# Altium footprint library DrPCB.PcbLib: 910 footprints (part 20 of 57)
Each footprint in its own frame and in the unit in brackets; x right, y up, seen from the top. Pads: shape width x height; smd on the part's side, far side on the other; paste and mask are expansions set on the pad; w line width, h text height; cw(c..) or ccw(c..) is an arc to the next point about the centre after c.
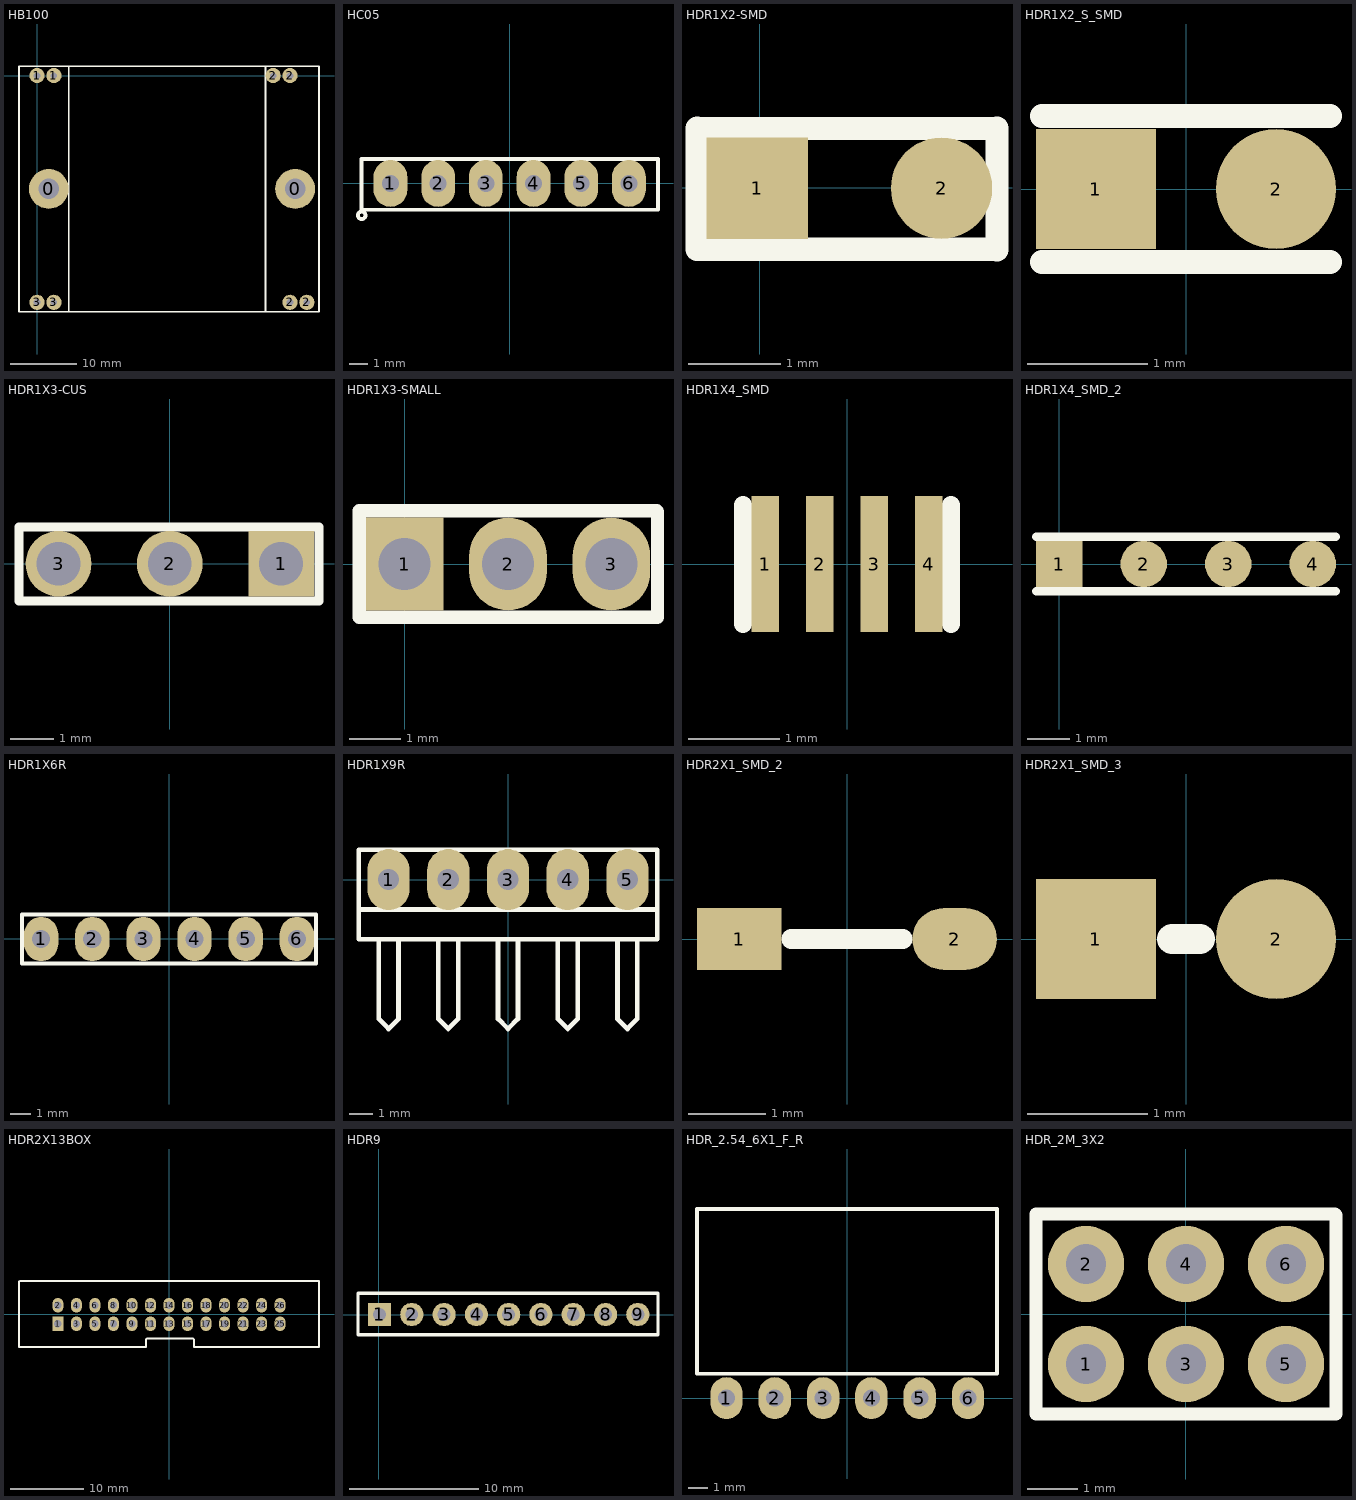
[diagram p19: the footprints below, top view; thin cyan lines are the x and y axes]

## HB100 [mm]
pads (10):
  round 6 hole 3.1: 0(1.778,-17.1) 0(38.935,-17.1)
  round 2.3 hole 1: 1(0,0) 1(2.54,0) 2(35.62,0) 2(38.16,-34.2) 2(38.16,0) 2(40.7,-34.2) 3(0,-34.2) 3(2.54,-34.2)
Top Overlay:
  lines w0.254: -2.722,1.397 -2.722,-35.61 42.535,-35.61 42.535,1.397 ; -2.718,1.4 42.532,1.4 ; 4.778,-35.607 4.778,1.4 ; 34.463,-35.607 34.463,1.4

## HC05 [mm] "HEADER FEMALE pitch: 2.54mm"
pads (6):
  oval 1.8x2.5 hole 0.9 mask+0.1: 1(-6.35,0) 2(-3.81,0) 3(-1.27,0) 4(1.27,0) 5(3.81,0) 6(6.35,0)
Top Overlay:
  circle w0.2: c-7.88,-1.7 r0.2
  lines w0.2: -7.9,-1.4 -7.9,1.3 7.9,1.3 7.9,-1.4 -7.9,-1.4
3D body "female_header_a-bl254-eg-g03d.stp": height 8.5, standoff -3.2, extent -7.745,-1.3 0.125,1.2
3D body "female_header_a-bl254-eg-g03d.stp": height 8.5, standoff -3.2, extent -0.125,-1.3 7.745,1.2
3D body "Bluetooth Module HC-05.STEP": height 45.26, standoff 2.43, extent -8,-0.374 8,6.426

## HDR1X2-SMD [mm]
pads (2):
  rect 1.1x1.1 smd: 1(-0.029,-0.005)
  round 1.1 smd: 2(1.971,-0.005)
Top Overlay:
  lines w0.254: -0.682,-0.668 2.572,-0.668 ; -0.678,-0.668 -0.678,0.643 ; -0.663,0.642 2.572,0.642 ; 2.572,-0.673 2.572,0.643

## HDR1X2_S_SMD [mm]
pads (2):
  rect 1x1 smd: 1(-0.75,0)
  round 1 smd: 2(0.75,0)
Top Overlay:
  lines w0.2: -1.2,-0.61 1.2,-0.61 ; -1.2,0.61 1.2,0.61

## HDR1X3-CUS [mm]
pads (3):
  rect 1.5x1.5 hole 1: 1(2.54,0)
  round 1.5 hole 1: 2(0,0) 3(-2.54,0)
Top Overlay:
  lines w0.2: -3.442,-0.851 -3.442,0.838 3.404,0.838 3.404,-0.851 -3.442,-0.851

## HDR1X3-SMALL [mm]
pads (3):
  rect 1.5x1.8 hole 1: 1(0,0)
  oval 1.5x1.8 hole 1: 2(2,0) 3(4,0)
Top Overlay:
  lines w0.254: 4.877,1.029 -0.876,1.029 -0.876,-1.029 4.889,-1.029 ; 4.889,-1.003 4.889,1.016

## HDR1X4_SMD [mm]
pads (4):
  rect 0.3x1.5 smd: 1(-0.9,0) 2(-0.3,0) 3(0.3,0) 4(0.9,0)
Top Overlay:
  lines w0.2: -1.143,-0.66 -1.143,0.648 ; 1.143,-0.66 1.143,0.648

## HDR1X4_SMD_2 [mm]
pads (4):
  rect 1.1x1.1 smd: 1(0,0)
  round 1.1 smd: 2(2,0) 3(4,0) 4(6,0)
Top Overlay:
  lines w0.2: -0.546,-0.648 6.54,-0.648 ; -0.546,0.648 6.54,0.648

## HDR1X6R [mm]
pads (6):
  oval 1.7x2.2 hole 0.9: 1(-6.35,0) 2(-3.81,0) 3(-1.27,0) 4(1.27,0) 5(3.81,0) 6(6.35,0)
Top Overlay:
  lines w0.2: -7.302,1.206 -7.302,-1.207 7.29,-1.206 ; -7.29,1.206 7.302,1.206 7.302,-1.206
3D body "User Library-Header_Male_RA_Low_6Pin.STEP": height 2.51, standoff -3, extent -7.607,-0.305 7.633,9.825

## HDR1X9R [mm] "Connector; Header; 5 Position"
pads (5):
  oval 1.8x2.6 hole 0.9 mask+0.1: 1(-5.08,0) 2(-2.54,0) 3(0,0) 4(2.54,0) 5(5.08,0)
Top Overlay:
  lines w0.2: -5.503,-2.54 -5.503,-5.927 -5.08,-6.35 -4.657,-5.927 -4.657,-2.54 ; -2.963,-2.54 -2.963,-5.927 -2.54,-6.35 -2.117,-5.927 -2.117,-2.54 ; -0.423,-2.54 -0.423,-5.927 0,-6.35 0.423,-5.927 0.423,-2.54 ; 2.117,-2.54 2.117,-5.927 2.54,-6.35 2.963,-5.927 2.963,-2.54 ; 4.657,-2.54 4.657,-5.927 5.08,-6.35 5.503,-5.927 5.503,-2.54 ; 6.35,-1.27 -6.35,-1.27 ; -6.35,-2.54 -6.35,1.27 ; -6.35,-2.54 6.35,-2.54 6.35,1.27 -6.35,1.27 ; -6.35,-2.54 -6.35,-1.27 ; -6.35,-1.27 -6.35,1.27
3D body "PLS-1R.step": height 5.45, standoff -3, extent 3.81,-7.35 6.35,1.27
3D body "PLS-1R.step": height 5.45, standoff -3, extent 1.27,-7.35 3.81,1.27
3D body "PLS-1R.step": height 5.45, standoff -3, extent -1.27,-7.35 1.27,1.27
3D body "PLS-1R.step": height 5.45, standoff -3, extent -3.81,-7.35 -1.27,1.27
3D body "PLS-1R.step": height 5.45, standoff -3, extent -6.35,-7.35 -3.81,1.27

## HDR2X1_SMD_2 [mm]
pads (2):
  rect 1.1x0.8 smd: 1(-1.4,0)
  oval 1.1x0.8 smd: 2(1.4,0)
Top Overlay:
  lines w0.254: -0.724,0 0.724,0

## HDR2X1_SMD_3 [mm]
pads (2):
  rect 1x1 smd: 1(-0.75,0)
  round 1 smd: 2(0.75,0)
Top Overlay:
  lines w0.254: -0.114,0 0.114,0

## HDR2X13BOX [mm]
pads (26):
  rect 1.5x2 hole 1: 1(-15.24,-1.27)
  oval 1.5x2 hole 1: 2(-15.24,1.27) 3(-12.7,-1.27) 4(-12.7,1.27) 5(-10.16,-1.27) 6(-10.16,1.27) 7(-7.62,-1.27) 8(-7.62,1.27) 9(-5.08,-1.27) 10(-5.08,1.27) 11(-2.54,-1.27) 12(-2.54,1.27) 13(0,-1.27) 14(0,1.27) 15(2.54,-1.27) 16(2.54,1.27) 17(5.08,-1.27) 18(5.08,1.27) 19(7.62,-1.27) 20(7.62,1.27) 21(10.16,-1.27) 22(10.16,1.27) 23(12.7,-1.27) 24(12.7,1.27) 25(15.24,-1.27) 26(15.24,1.27)
Top Overlay:
  lines w0.254: -20.574,4.555 -20.574,-4.445 -3.175,-4.445 -3.175,-3.429 -3.048,-3.302 3.302,-3.302 3.429,-3.429 3.429,-4.445 20.426,-4.445 ; -20.447,4.572 20.553,4.572 ; 20.574,-4.445 20.574,4.555

## HDR9 [mm]
pads (9):
  rect 1.8x1.8 hole 1: 1(0.068,0.035)
  round 1.8 hole 1: 2(2.568,0.035) 3(5.068,0.035) 4(7.568,0.035) 5(10.068,0.035) 6(12.568,0.035) 7(15.068,0.035) 8(17.568,0.035) 9(20.068,0.035)
Top Overlay:
  lines w0.254: -1.596,-1.533 21.627,-1.533 21.627,1.68 -1.596,1.68 -1.596,-1.533

## HDR_2.54_6X1_F_R [mm]
pads (6):
  oval 1.7x2.2 hole 0.9: 1(-6.35,0) 2(-3.81,0) 3(-1.27,0) 4(1.27,0) 5(3.81,0) 6(6.35,0)
Top Overlay:
  lines w0.2: -7.899,1.283 -7.899,9.944 7.874,9.944 7.874,1.283 -7.899,1.283
3D body "female_header_a-bl254-ea-g06d.stp": height 2.51, standoff -3.19, extent -7.745,-0.239 7.745,9.821

## HDR_2M_3X2 [mm]
pads (6):
  round 1.524 hole 0.8: 1(-2,-1) 2(-2,1) 3(0,-1) 4(0,1) 5(2,-1) 6(2,1)
Top Overlay:
  lines w0.254: -3,1.981 -3,-2 2.981,-2 ; -3,2 2.981,2 ; 3,-2 3,1.981